# Altium footprint library OT Library.PcbLib: 396 footprints (part 25 of 25)
Each footprint in its own frame and in the unit in brackets; x right, y up, seen from the top. Pads: shape width x height; smd on the part's side, far side on the other; paste and mask are expansions set on the pad; w line width, h text height; cw(c..) or ccw(c..) is an arc to the next point about the centre after c.
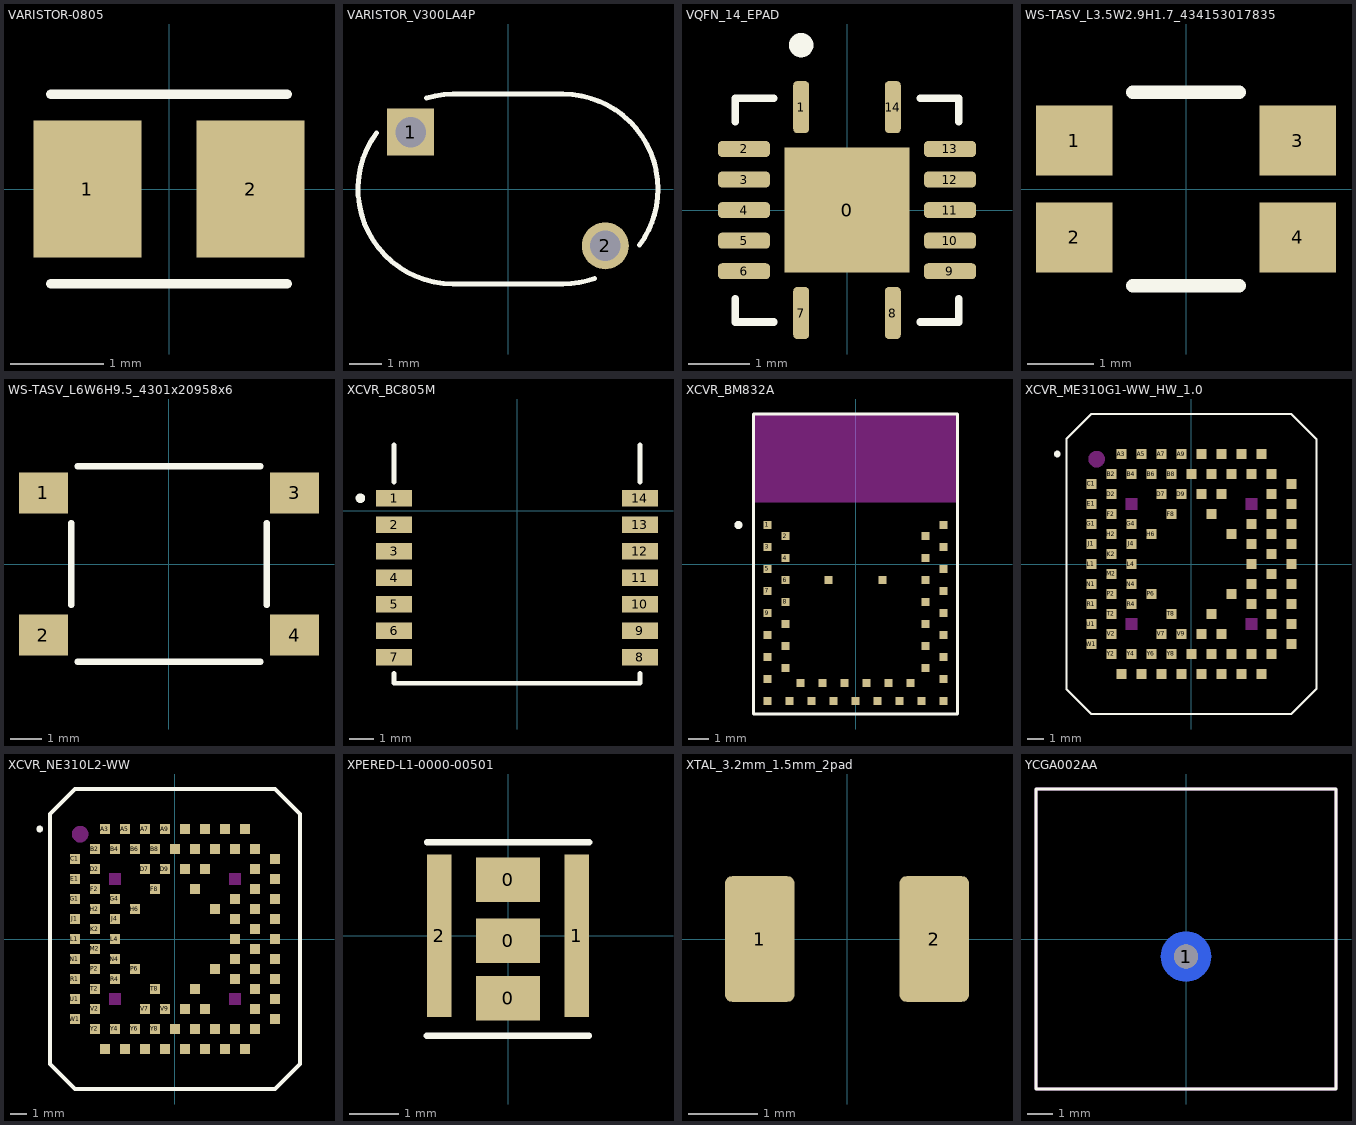
[diagram p24: the footprints below, top view; thin cyan lines are the x and y axes]

## VARISTOR-0805 [mm]
pads (2):
  rect 1.16x1.47 smd: 1(-0.875,0) 2(0.875,0)
Top Overlay:
  lines w0.1: -1.27,-1.016 1.27,-1.016 ; -1.27,1.016 1.27,1.016
3D body: height 1.2, standoff 0, extent -1,-0.625 1,0.625

## VARISTOR_V300LA4P [mil]
pads (2):
  rect 57x57 hole 37: 1(-118.11,68.9)
  round 57 hole 37: 2(118.11,-68.9)
Top Overlay:
  lines w6: -159.71,68.04 ccw(c-67,0) -67,-115 67,-115 ccw(c67,0) 105.24,-108.46 ; -98.86,110.5 cw(c-67,0) -67,115 67,115 cw(c67,0) 182,0 cw(c67,0) 159.7,-68.05
Top Solder:
  region: 118.11,-97.64 125.55,-96.66 132.48,-93.79 138.44,-89.22 143,-83.27 145.88,-76.34 146.86,-68.9 145.88,-61.46 143,-54.52 138.44,-48.57 132.48,-44 125.55,-41.13 118.11,-40.15 110.67,-41.13 103.74,-44 97.78,-48.57 93.22,-54.52 90.34,-61.46 89.36,-68.9 90.34,-76.34 93.22,-83.27 97.78,-89.22 103.74,-93.79 110.67,-96.66
  region: -146.61,40.4 -89.61,40.4 -89.61,97.4 -146.61,97.4
Bottom Solder:
  region: 118.11,-97.64 125.55,-96.66 132.48,-93.79 138.44,-89.22 143,-83.27 145.88,-76.34 146.86,-68.9 145.88,-61.46 143,-54.52 138.44,-48.57 132.48,-44 125.55,-41.13 118.11,-40.15 110.67,-41.13 103.74,-44 97.78,-48.57 93.22,-54.52 90.34,-61.46 89.36,-68.9 90.34,-76.34 93.22,-83.27 97.78,-89.22 103.74,-93.79 110.67,-96.66
  region: -146.61,40.4 -89.61,40.4 -89.61,97.4 -146.61,97.4
3D body: height 476.38, standoff -196.85, extent -177.16,-111.76 177.16,108.71

## VQFN_14_EPAD [mm]
pads (15):
  rect 2.05x2.05 smd paste-2: 0(0,0)
  rrect50% 0.26x0.85 smd: 1(-0.75,1.685) 7(-0.75,-1.685) 8(0.75,-1.685) 14(0.75,1.685)
  rrect50% 0.85x0.26 smd: 2(-1.685,1) 3(-1.685,0.5) 4(-1.685,0) 5(-1.685,-0.5) 6(-1.685,-1) 9(1.685,-1) 10(1.685,-0.5) 11(1.685,0) 12(1.685,0.5) 13(1.685,1)
Top Overlay:
  circle w0.2: c-0.75,2.7 r0.1
  lines w0.127: -1.83,-1.45 -1.83,-1.83 -1.2,-1.83 ; -1.83,1.45 -1.83,1.83 -1.2,1.83 ; 1.2,-1.83 1.83,-1.83 1.83,-1.45 ; 1.2,1.83 1.83,1.83 1.83,1.45
Top Paste:
  region: -0.1,-0.83 -0.83,-0.83 -0.83,-0.1 -0.1,-0.1
  region: 0.83,0.1 0.1,0.1 0.1,0.83 0.83,0.83
  region: -0.1,0.1 -0.83,0.1 -0.83,0.83 -0.1,0.83
  region: 0.83,-0.83 0.1,-0.83 0.1,-0.1 0.83,-0.1
3D body: height 1, standoff 0, extent -1.75,-1.75 1.75,1.75

## WS-TASV_L3.5W2.9H1.7_434153017835 [mm] "Tact Switch, SMD, body 3.5x2.9mm"
height 1.7
pads (4):
  rect 1.15x1.05 smd: 1(-1.675,0.725) 2(-1.675,-0.725) 3(1.675,0.725) 4(1.675,-0.725)
Top Overlay:
  lines w0.2: -0.8,-1.45 0.8,-1.45 ; -0.8,1.45 0.8,1.45
3D body: height 1.7, standoff 0, extent -2.147,-1.45 2.147,1.45

## WS-TASV_L6W6H9.5_4301x20958x6 [mm] "SMD Tact Switch, body 6x6mm"
height 9.5
pads (4):
  rect 1.55x1.3 smd: 1(-3.975,2.25) 2(-3.975,-2.25) 3(3.975,2.25) 4(3.975,-2.25)
Top Overlay:
  lines w0.2: -3.1,-1.3 -3.1,1.3 ; -2.9,-3.1 2.9,-3.1 ; -2.9,3.1 2.9,3.1 ; 3.1,-1.3 3.1,1.3
3D body: height 9.5, standoff 0, extent -4.5,-3.1 4.5,3.1

## XCVR_BC805M [mm]
height 1.9
pads (14):
  rect 1.5x0.7 smd: 1(-5.1,0.53) 2(-5.1,-0.57) 3(-5.1,-1.67) 4(-5.1,-2.77) 5(-5.1,-3.87) 6(-5.1,-4.97) 7(-5.1,-6.07) 8(5.1,-6.07) 9(5.1,-4.97) 10(5.1,-3.87) 11(5.1,-2.77) 12(5.1,-1.67) 13(5.1,-0.57) 14(5.1,0.53)
Top Overlay:
  circle w0.2: c-6.5,0.53 r0.1
  lines w0.2: -5.1,-6.74 -5.1,-7.15 5.1,-7.15 5.1,-6.74 ; -5.1,1.2 -5.1,2.75 ; 5.1,1.2 5.1,2.75
3D body: height 1.9, standoff 0, extent -5.1,-7.15 5.1,7.15

## XCVR_BM832A [mm]
height 1.9
pads (47):
  rect 0.4x0.4 smd: 1(-4.41,1.95) 2(-3.51,1.4) 3(-4.41,0.85) 4(-3.51,0.3) 5(-4.41,-0.25) 6(-3.51,-0.8) 7(-4.41,-1.35) 8(-3.51,-1.9) 9(-4.41,-2.45) 10(-3.51,-3) 11(-4.41,-3.55) 12(-3.51,-4.1) 13(-4.41,-4.65) 14(-3.51,-5.2) 15(-4.41,-5.75) 16(-4.41,-6.85) 17(-3.31,-6.85) 18(-2.76,-5.95) 19(-2.21,-6.85) 20(-1.66,-5.95) 21(-1.11,-6.85) 22(-0.56,-5.95) 23(-0.01,-6.85) 24(0.54,-5.95) 25(1.09,-6.85) 26(1.64,-5.95) 27(2.19,-6.85) 28(2.74,-5.95) 29(3.29,-6.85) 30(4.39,-6.85) 31(4.39,-5.75) 32(3.49,-5.2) 33(4.39,-4.65) 34(3.49,-4.1) 35(4.39,-3.55) 36(3.49,-3) 37(4.39,-2.45) 38(3.49,-1.9) 39(4.39,-1.35) 40(3.49,-0.8) 41(4.39,-0.25) 42(3.49,0.3) 43(4.39,0.85) 44(3.49,1.4) 45(4.39,1.95) 46(1.34,-0.8) 47(-1.36,-0.8)
Top Overlay:
  circle w0.2: c-5.85,1.95 r0.1
  lines w0.127: -5.1,-7.5 -5.1,7.5 5.1,7.5 5.1,-7.5 -5.1,-7.5
Keep-Out Layer:
  region: 5.1,3.1 -5.1,3.1 -5.1,7.5 5.1,7.5
3D body: height 1.85, standoff 0, extent -5.1,-7.4 5.1,7.4

## XCVR_ME310G1-WW_HW_1.0 [mm]
height 2.75
pads (94):
  rect 0.6x0.6 smd mask+0.1: A3(-4.2,6.6) A5(-3,6.6) A7(-1.8,6.6) A9(-0.6,6.6) A11(0.6,6.6) A13(1.8,6.6) A15(3,6.6) A17(4.2,6.6) AA3(-4.2,-6.6) AA5(-3,-6.6) AA7(-1.8,-6.6) AA9(-0.6,-6.6) AA11(0.6,-6.6) AA13(1.8,-6.6) AA15(3,-6.6) AA17(4.2,-6.6) B2(-4.8,5.4) B4(-3.6,5.4) B6(-2.4,5.4) B8(-1.2,5.4) B10(0,5.4) B12(1.2,5.4) B14(2.4,5.4) B16(3.6,5.4) B18(4.8,5.4) C1(-6,4.8) C19(6,4.8) D2(-4.8,4.2) D7(-1.8,4.2) D9(-0.6,4.2) D11(0.6,4.2) D13(1.8,4.2) D18(4.8,4.2) E1(-6,3.6) E19(6,3.6) F2(-4.8,3) F8(-1.2,3) F12(1.2,3) F18(4.8,3) G1(-6,2.4) G4(-3.6,2.4) G16(3.6,2.4) G19(6,2.4) H2(-4.8,1.8) H6(-2.4,1.8) H14(2.4,1.8) H18(4.8,1.8) J1(-6,1.2) J4(-3.6,1.2) J16(3.6,1.2) J19(6,1.2) K2(-4.8,0.6) K18(4.8,0.6) L1(-6,0) L4(-3.6,0) L16(3.6,0) L19(6,0) M2(-4.8,-0.6) M18(4.8,-0.6) N1(-6,-1.2) N4(-3.6,-1.2) N16(3.6,-1.2) N19(6,-1.2) P2(-4.8,-1.8) P6(-2.4,-1.8) P14(2.4,-1.8) P18(4.8,-1.8) R1(-6,-2.4) R4(-3.6,-2.4) R16(3.6,-2.4) R19(6,-2.4) T2(-4.8,-3) T8(-1.2,-3) T12(1.2,-3) T18(4.8,-3) U1(-6,-3.6) U19(6,-3.6) V2(-4.8,-4.2) V7(-1.8,-4.2) V9(-0.6,-4.2) V11(0.6,-4.2) V13(1.8,-4.2) V18(4.8,-4.2) W1(-6,-4.8) W19(6,-4.8) Y2(-4.8,-5.4) Y4(-3.6,-5.4) Y6(-2.4,-5.4) Y8(-1.2,-5.4) Y10(0,-5.4) Y12(1.2,-5.4) Y14(2.4,-5.4) Y16(3.6,-5.4) Y18(4.8,-5.4)
Top Overlay:
  circle w0.2: c-8.05,6.6 r0.1
  lines w0.127: -7.5,-7.5 -7.5,7.5 -6,9 6,9 7.5,7.5 7.5,-7.5 6,-9 -6,-9 -7.5,-7.5
Keep-Out Layer:
  circle w0.5: c-5.69,6.29 r0.25
  region: -3.25,3.25 -3.95,3.25 -3.95,3.95 -3.25,3.95
  region: 3.95,3.25 3.25,3.25 3.25,3.95 3.95,3.95
  region: -3.25,-3.95 -3.95,-3.95 -3.95,-3.25 -3.25,-3.25
  region: 3.95,-3.95 3.25,-3.95 3.25,-3.25 3.95,-3.25
3D body: height 2.6, standoff 0, extent -7.5,-9 7.5,9

## XCVR_NE310L2-WW [mm]
height 2.75
pads (94):
  rect 0.6x0.6 smd mask+0.1: A3(-4.2,6.6) A5(-3,6.6) A7(-1.8,6.6) A9(-0.6,6.6) A11(0.6,6.6) A13(1.8,6.6) A15(3,6.6) A17(4.2,6.6) AA3(-4.2,-6.6) AA5(-3,-6.6) AA7(-1.8,-6.6) AA9(-0.6,-6.6) AA11(0.6,-6.6) AA13(1.8,-6.6) AA15(3,-6.6) AA17(4.2,-6.6) B2(-4.8,5.4) B4(-3.6,5.4) B6(-2.4,5.4) B8(-1.2,5.4) B10(0,5.4) B12(1.2,5.4) B14(2.4,5.4) B16(3.6,5.4) B18(4.8,5.4) C1(-6,4.8) C19(6,4.8) D2(-4.8,4.2) D7(-1.8,4.2) D9(-0.6,4.2) D11(0.6,4.2) D13(1.8,4.2) D18(4.8,4.2) E1(-6,3.6) E19(6,3.6) F2(-4.8,3) F8(-1.2,3) F12(1.2,3) F18(4.8,3) G1(-6,2.4) G4(-3.6,2.4) G16(3.6,2.4) G19(6,2.4) H2(-4.8,1.8) H6(-2.4,1.8) H14(2.4,1.8) H18(4.8,1.8) J1(-6,1.2) J4(-3.6,1.2) J16(3.6,1.2) J19(6,1.2) K2(-4.8,0.6) K18(4.8,0.6) L1(-6,0) L4(-3.6,0) L16(3.6,0) L19(6,0) M2(-4.8,-0.6) M18(4.8,-0.6) N1(-6,-1.2) N4(-3.6,-1.2) N16(3.6,-1.2) N19(6,-1.2) P2(-4.8,-1.8) P6(-2.4,-1.8) P14(2.4,-1.8) P18(4.8,-1.8) R1(-6,-2.4) R4(-3.6,-2.4) R16(3.6,-2.4) R19(6,-2.4) T2(-4.8,-3) T8(-1.2,-3) T12(1.2,-3) T18(4.8,-3) U1(-6,-3.6) U19(6,-3.6) V2(-4.8,-4.2) V7(-1.8,-4.2) V9(-0.6,-4.2) V11(0.6,-4.2) V13(1.8,-4.2) V18(4.8,-4.2) W1(-6,-4.8) W19(6,-4.8) Y2(-4.8,-5.4) Y4(-3.6,-5.4) Y6(-2.4,-5.4) Y8(-1.2,-5.4) Y10(0,-5.4) Y12(1.2,-5.4) Y14(2.4,-5.4) Y16(3.6,-5.4) Y18(4.8,-5.4)
Top Overlay:
  circle w0.2: c-8.112,6.6 r0.1
  lines w0.254: -7.5,-7.5 -6,-9 6,-9 7.5,-7.5 7.5,7.5 6,9 -6,9 -7.5,7.5 -7.5,-7.5
Keep-Out Layer:
  circle w0.5: c-5.69,6.29 r0.25
  region: 3.95,-3.95 3.25,-3.95 3.25,-3.25 3.95,-3.25
  region: -3.25,-3.95 -3.95,-3.95 -3.95,-3.25 -3.25,-3.25
  region: 3.95,3.25 3.25,3.25 3.25,3.95 3.95,3.95
  region: -3.25,3.25 -3.95,3.25 -3.95,3.95 -3.25,3.95
3D body: height 2.6, standoff 0, extent -7.5,-9 7.5,9

## XPERED-L1-0000-00501 [mm] "0.136\" L x 0.136\" W (3.45mm x 3.45mm)"
height 2.13
pads (5):
  rect 1.3x0.9 smd: 0(0,-1.27) 0(0,-0.1) 0(0,1.143)
  rect 0.5x3.3 smd: 1(1.4,0) 2(-1.4,0)
Top Overlay:
  lines w0.127: -1.651,-2.032 1.649,-2.032 ; -1.649,1.905 1.651,1.905
3D body: height 2.03, standoff -0.57, extent -1.29,-1.397 1.3,1.198
3D body: height 0.73, standoff 0, extent -1.778,-1.941 1.778,1.742

## XTAL_3.2mm_1.5mm_2pad [mm]
height 1.3
pads (2):
  rrect20% 1x1.8 smd mask+0.102: 1(-1.25,0) 2(1.25,0)
3D body: height 0.91, standoff 0, extent -1.61,-0.76 1.61,0.76

## YCGA002AA [mm] "12X12MM"
height 4.8
pads (2):
  round 2 smd far side paste-2: 1(0,-0.7)
  round 0.95 hole 0.95: 1(0,-0.7)
Top Overlay:
  lines w0.127: -6,-6 6,-6 6,6 -6,6 -6,-6
Top Solder:
  rectangle: -5.969,-5.969 5.969,5.969
3D Top:
  lines w0.127: -6,-6 6,-6 6,6 -6,6 -6,-6
Multi-Layer:
  pour cut-out: 1.513,-0.7 1.462,-0.318 1.315,0.037 1.081,0.343 0.775,0.577 0.42,0.724 0.038,0.775 0.038,0.762 0,0.769 -0.299,0.74 -0.586,0.653 -0.851,0.511 -1.083,0.321 -1.273,0.089 -1.415,-0.176 -1.502,-0.463 -1.531,-0.762 -1.536,-0.762 -1.488,-1.127 -1.347,-1.467 -1.123,-1.758 -0.832,-1.982 -0.492,-2.123 -0.127,-2.171 -0.127,-2.159 0.041,-2.172 0.422,-2.121 0.777,-1.974 1.082,-1.741 1.315,-1.436 1.462,-1.081
3D body: height 4.8, standoff -1.8, extent -6,-6 6,6